# Altium footprint library Vowstar_Connector.PcbLib: 127 footprints (part 8 of 8)
Each footprint in its own frame and in the unit in brackets; x right, y up, seen from the top. Pads: shape width x height; smd on the part's side, far side on the other; paste and mask are expansions set on the pad; w line width, h text height; cw(c..) or ccw(c..) is an arc to the next point about the centre after c.
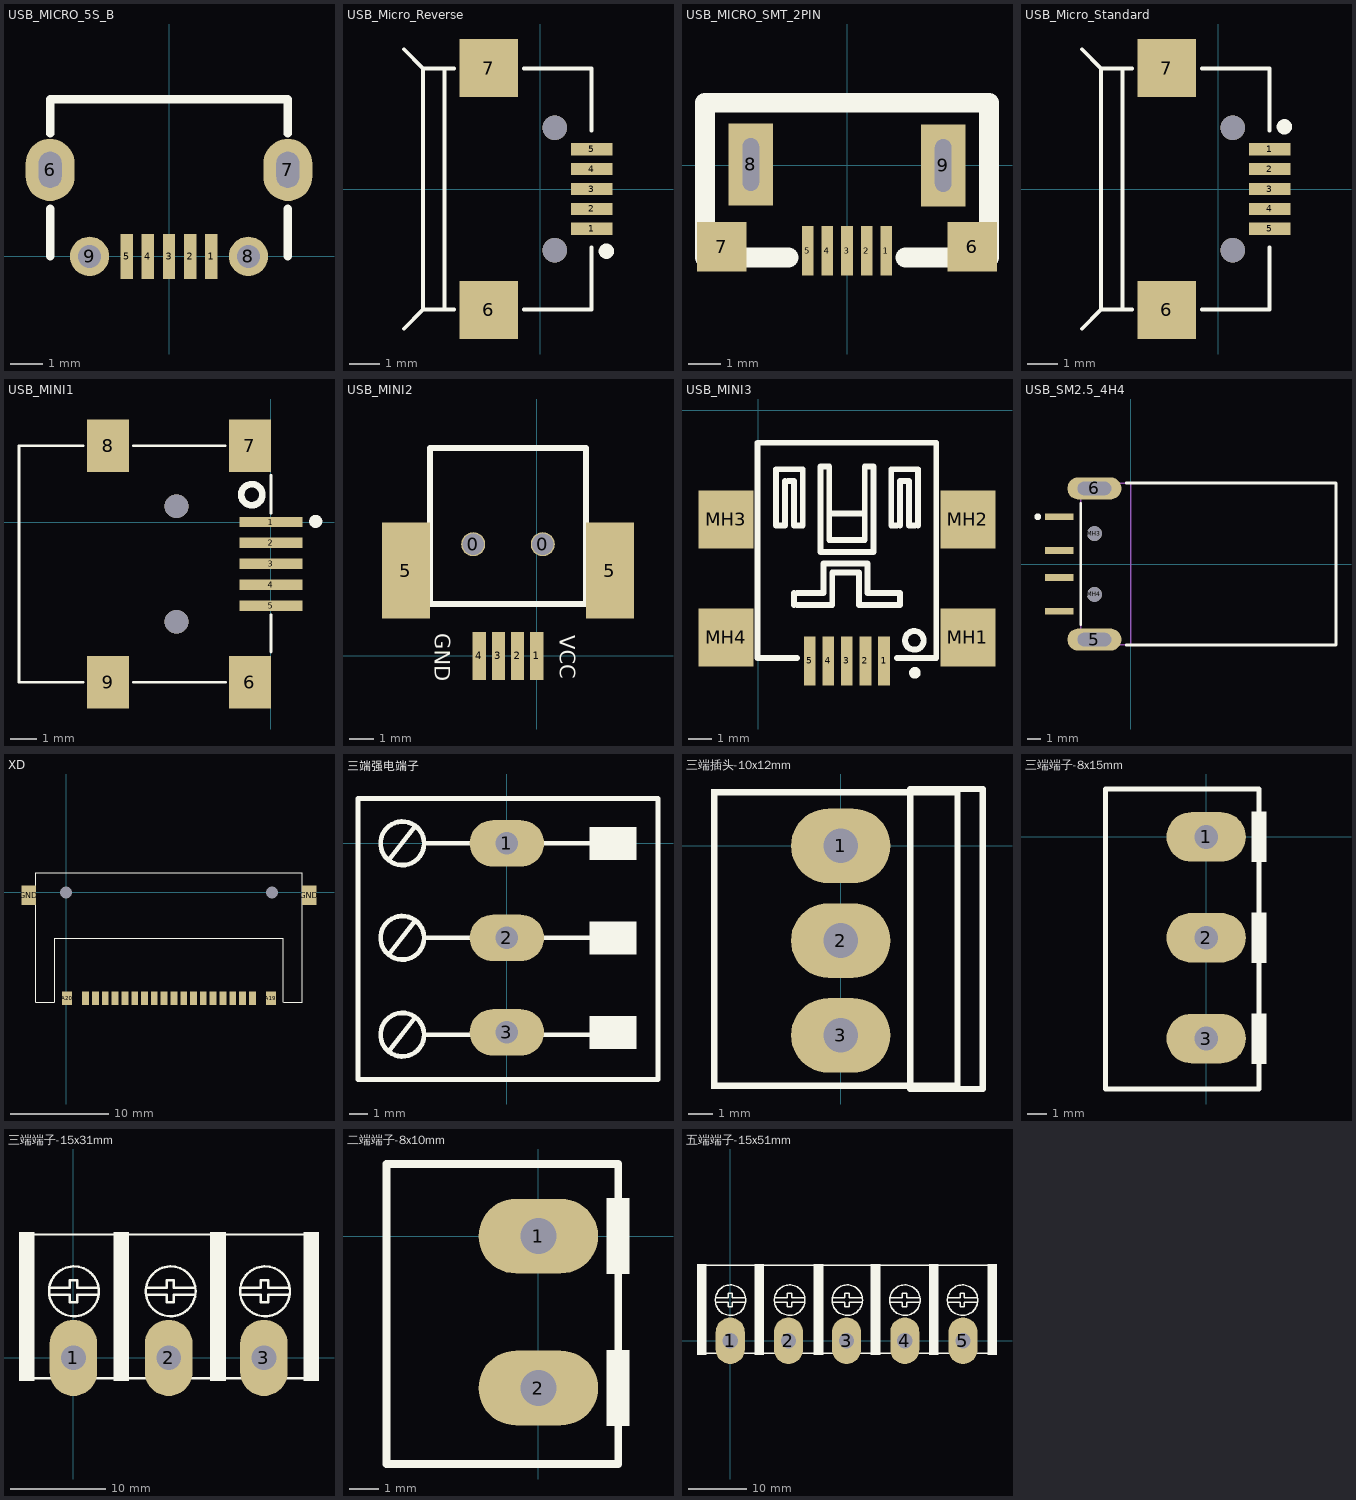
[diagram p7: the footprints below, top view; thin cyan lines are the x and y axes]

## USB_MICRO_5S_B [mil] "USB Micro SMT 5S B"
height 118.11
pads (9):
  rect 15x54 smd: 1(51,0) 2(25.5,0) 3(0,0) 4(-25.5,0) 5(-51,0)
  oval 59.06x74.8 hole 27.56 slot 43.31 at 90 deg: 6(-143,104) 7(143,104)
  round 47.24 hole 27.5: 8(95.5,0) 9(-95.5,0)
Top Overlay:
  lines w10: -142.72,0 -142.72,57.28 ; -142.72,147.72 -142.72,188.98 142.72,188.98 142.72,147.72 ; 142.72,0 142.72,57.28
3D body "User Library-Micro USB-B_Molex_105017-0001.step": height 105.31, standoff -24.61, extent -161.42,-9.33 161.41,204.44

## USB_Micro_Reverse [mm] "Micro USB Dock 5 Pin Reverse"
height 3
pads (7):
  rect 1.35x0.4 smd: 1(1.679,-1.3) 2(1.679,-0.65) 3(1.679,0) 4(1.679,0.65) 5(1.679,1.3)
  rect 1.9x1.9 smd: 6(-1.679,-3.95) 7(-1.679,3.95)
via 0.471,-2 diameter 0.8 hole 0.8
via 0.471,2 diameter 0.8 hole 0.8
Top Overlay:
  circle w0.25: c2.161,-2.032 r0.125
  lines w0.127: -4.459,-4.567 -3.829,-3.937 -2.813,-3.937 ; -4.459,4.567 -3.829,3.937 -2.813,3.937 ; -3.829,-3.9 -3.829,3.9 ; -3.13,-3.863 -3.13,3.937 ; -0.527,-3.937 1.679,-3.937 ; -0.527,3.937 1.679,3.937 ; 1.679,-3.9 1.679,-1.905 ; 1.679,1.905 1.679,3.9
3D body "User Library-Micro USB.step": height 2.67, standoff -0.27, extent -4.318,-3.99 1.112,3.99

## USB_MICRO_SMT_2PIN [mm] "USB MICRO SMT 2PIN"
height 3
pads (9):
  rect 0.35x1.5 smd: 1(1.2,-2.59) 2(0.6,-2.59) 3(0,-2.59) 4(-0.6,-2.59) 5(-1.2,-2.59)
  rrect0% 1.5x1.5 smd: 6(3.81,-2.47) 7(-3.81,-2.47)
  rect 1.35x2.5 hole 0.5 slot 1.6 at 90 deg: 8(-2.925,0.03) 9(2.925,0)
Top Overlay:
  lines w0.6: -1.778,-2.8 -4.318,-2.8 -4.318,1.91 4.318,1.91 4.318,-2.8 1.778,-2.8

## USB_Micro_Standard [mm] "Micro USB Dock 5 Pin Standard"
height 3
pads (7):
  rect 1.35x0.4 smd: 1(1.679,1.3) 2(1.679,0.65) 3(1.679,0) 4(1.679,-0.65) 5(1.679,-1.3)
  rect 1.9x1.9 smd: 6(-1.679,-3.95) 7(-1.679,3.95)
via 0.471,-2 diameter 0.8 hole 0.8
via 0.471,2 diameter 0.8 hole 0.8
Top Overlay:
  circle w0.25: c2.161,2.032 r0.125
  lines w0.127: -4.459,-4.567 -3.829,-3.937 -2.813,-3.937 ; -4.459,4.567 -3.829,3.937 -2.813,3.937 ; -3.829,-3.9 -3.829,3.9 ; -3.13,-3.863 -3.13,3.937 ; -0.527,-3.937 1.679,-3.937 ; -0.527,3.937 1.679,3.937 ; 1.679,-3.9 1.679,-1.905 ; 1.679,1.905 1.679,3.9
3D body "User Library-Micro USB.step": height 2.67, standoff -0.27, extent -4.318,-3.99 1.112,3.99

## USB_MINI1 [mm] "USB Mini SMT"
height 5.08
pads (9):
  rect 2.4x0.4 smd: 1(0,0) 2(0,-0.8) 3(0,-1.6) 4(0,-2.4) 5(0,-3.2)
  rect 1.6x2 smd: 6(-0.8,-6.1) 7(-0.8,2.9) 8(-6.2,2.9) 9(-6.2,-6.1)
via -3.6,0.6 diameter 0.9 hole 0.9
via -3.6,-3.8 diameter 0.9 hole 0.9
Top Overlay:
  circle w0.254: c-0.732,1.041 r0.402
  circle w0.25: c1.704,0.025 r0.125
  lines w0.1: -7.163,-6.1 -9.6,-6.1 -9.6,2.9 -7.163,2.9 ; -5.248,-6.1 -1.727,-6.1 ; -5.248,2.9 -1.752,2.9 ; 0,-4.953 0,-3.531 ; 0,0.33 0,1.778
3D body "User Library-USB_mini_B.step": height 3.95, standoff -1, extent -9.525,-6.95 -0.325,3.75

## USB_MINI2 [mm] "USB Mini SMT"
height 5.08
pads (8):
  round 1 hole 0.9: 0(-2.65,4.65) 0(0.25,4.65)
  rect 0.55x2 smd: 1(0,0) 2(-0.8,0) 3(-1.6,0) 4(-2.4,0)
  rect 2x4 smd: 5(-5.45,3.55) 5(3.05,3.55)
Top Overlay:
  lines w0.254: -4.45,2.15 -4.45,8.65 2.05,8.65 2.05,2.15 -4.45,2.15
  text "VCC" at 0.95,0.85 h0.64
  text "GND" at -4.25,0.95 h0.64

## USB_MINI3 [mm] "USB Mini SMT"
height 5.08
pads (9):
  rect 0.5x2.096 smd: 1(5.404,-10.792) 2(4.604,-10.792) 3(3.804,-10.792) 4(3.004,-10.792) 5(2.204,-10.792)
  rect 2.35x2.5 smd: MH1(9.017,-9.779) MH2(9.017,-4.699) MH3(-1.397,-4.699) MH4(-1.397,-9.779)
Top Overlay:
  circle w0.254: c6.71,-9.906 r0.402
  circle w0.25: c6.733,-11.303 r0.125
  lines w0.254: 1.143,-3.048 1.143,-4.953 0.762,-4.953 0.762,-2.54 1.905,-2.54 1.905,-4.953 1.524,-4.953 1.524,-3.048 1.27,-3.048 ; 1.524,-8.382 1.524,-7.874 ; 1.651,-10.668 -0.046,-10.668 -0.046,-1.397 7.654,-1.397 7.654,-10.668 5.969,-10.668 ; 1.651,-8.382 3.175,-8.382 3.175,-6.985 4.318,-6.985 4.318,-8.382 6.096,-8.382 6.096,-7.874 4.699,-7.874 4.699,-6.604 2.794,-6.604 2.794,-7.874 1.651,-7.874 ; 3.048,-4.445 4.572,-4.445 ; 5.969,-4.953 5.715,-4.953 5.715,-2.54 6.858,-2.54 6.858,-4.953 ; 6.096,-4.953 6.096,-3.048 6.477,-3.048 6.477,-4.953 6.731,-4.953 ; 2.667,-6.096 2.667,-2.413 3.048,-2.413 3.048,-5.588 4.572,-5.588 4.572,-2.413 4.953,-2.413 4.953,-6.096 2.667,-6.096

## USB_SM2.5_4H4 [mm] "Connector; USB1.1, Type A, SM; 4 Position; Right Angle"
height 4.5
pads (8):
  rect 2.1x0.5 smd: 1(-5.3,3.5) 2(-5.3,1) 3(-5.3,-1) 4(-5.3,-3.5)
  oval 4x1.65 hole 1 slot 2.5 at 0 deg: 5(-2.7,-5.6) 6(-2.7,5.6)
  round 1.1 hole 1.1 unplated paste-2.54 mask-2.54: MH3(-2.7,2.25) MH4(-2.7,-2.25)
Top Overlay:
  circle w0.25: c-6.9,3.5 r0.125
  lines w0.2: -3.7,-4.475 -3.7,4.475 ; -0.33,-6 15.2,-6 15.2,6 -0.33,6
Mechanical 13:
  lines w0.1: 0,-6 0,6 ; -3.7,-6 15.2,-6 15.2,6 -3.7,6 -3.7,-6
  text "PCB Edge" at 0.473,-5.173 h0.25
3D body "User Library-USBSM2.5-4H4.step": height 3.12, standoff -2.58, extent -5.702,-6.248 14.998,6.252

## XD [mm]
pads (24):
  round 0 hole 1.2 unplated: 0(21,0) 1(0,0)
  rect 0.7x1.4 smd: A1(19,-10.8) A2(18,-10.8) A3(17,-10.8) A4(16,-10.8) A5(15,-10.8) A6(14,-10.8) A7(13,-10.8) A8(12,-10.8) A9(11,-10.8) A10(10,-10.8) A11(9,-10.8) A12(8,-10.8) A13(7,-10.8) A14(6,-10.8) A15(5,-10.8) A16(4,-10.8) A17(3,-10.8) A18(2,-10.8)
  rect 1x1.4 smd: A19(20.9,-10.8) A20(0.1,-10.8)
  rect 1.5x2 smd: GND(-3.8,-0.3) GND(24.8,-0.3)
Top Overlay:
  lines w0.127: -1.2,-11.19 -3.1,-11.19 -3.1,2.01 24.1,2.01 24.1,-11.19 22.2,-11.19 ; -1.16,-11.19 -1.16,-4.69 22.14,-4.69 22.14,-11.19

## 三端强电端子 [mm] "三端强电端子"
height 15
pads (3):
  oval 4x2.5 hole 1.2: 1(0,0) 2(0,-5.08) 3(0,-10.16)
Top Overlay:
  circle w0.254: c-5.616,-10.287 r1.171
  circle w0.254: c-5.616,-5.08 r1.171
  circle w0.254: c-5.616,0 r1.171
  rectangle: 4.445,-11.049 6.985,-9.271
  rectangle: 4.445,-5.969 6.985,-4.191
  rectangle: 4.445,-0.889 6.985,0.889
  lines w0.254: -6.35,-11.176 -4.953,-9.398 ; -6.35,-5.969 -4.953,-4.191 ; -6.35,-0.889 -4.953,0.889 ; -4.445,-10.287 4.572,-10.287 ; -4.445,-5.08 4.445,-5.08 ; -4.445,0 4.953,0 ; -8.001,-12.7 -8.001,2.413 8.128,2.413 8.128,-12.7 -8.001,-12.7
3D body: height 16, standoff 0, extent -8.001,-12.573 8.001,2.286

## 三端插头-10x12mm [mm] "三端插头10x12mm"
height 13
pads (3):
  oval 4x3 hole 1.4: 1(0,0) 2(0,-3.81) 3(0,-7.62)
Top Overlay:
  rectangle: -5.207,2.032 4.826,2.286
  rectangle: 4.572,-9.779 4.826,2.286
  rectangle: -5.207,-9.779 4.826,-9.525
  rectangle: -5.207,-9.779 -4.953,2.286
  lines w0.254: 2.794,-9.779 2.794,2.286 5.715,2.286 5.715,-9.779 2.794,-9.779
3D body: height 13, standoff -1, extent -0.508,-8.001 0.508,-7.239
3D body: height 13, standoff -1, extent -0.508,-4.191 0.508,-3.429
3D body: height 13, standoff -1, extent -0.508,-0.381 0.508,0.381
3D body: height 13, standoff 0, extent 2.667,-9.652 5.588,2.159
3D body: height 3, standoff 0, extent -5.08,-9.652 5.588,2.159

## 三端端子-8x15mm [mm] "三端端子-8x15mm"
height 10
pads (3):
  oval 4x2.5 hole 1.2: 1(0,0) 2(0,-5.08) 3(0,-10.16)
Top Overlay:
  rectangle: 2.286,-11.43 3.048,-8.89
  rectangle: 2.286,-6.35 3.048,-3.81
  rectangle: 2.286,-1.27 3.048,1.27
  lines w0.254: -5.08,-12.7 2.667,-12.7 2.667,2.413 -5.08,2.413 -5.08,-12.7

## 三端端子-15x31mm [mm] "三端端子-15x31mm"
height 15
pads (3):
  oval 5x8 hole 2.6: 1(0,0) 2(10,0) 3(20,0)
Top Overlay:
  circle w0.254: c0.052,6.985 r2.615
  circle w0.254: c10.212,6.985 r2.615
  circle w0.254: c20.118,6.985 r2.615
  rectangle: 24.13,-2.413 25.781,13.208
  rectangle: 14.351,-2.413 16.002,13.208
  rectangle: 4.191,-2.413 5.842,13.208
  rectangle: -5.715,-2.413 -4.064,13.208
  lines w0.254: -5.588,-2.159 -5.588,12.954 25.654,12.954 25.654,-2.159 ; -5.588,-2.134 25.654,-2.134 ; -2.54,6.604 -0.381,6.604 -0.381,5.842 0.381,5.842 0.381,6.604 2.54,6.604 ; -2.54,7.366 -0.381,7.366 -0.381,8.128 0.381,8.128 0.381,7.366 2.54,7.366 ; 7.62,6.604 9.779,6.604 9.779,5.842 10.541,5.842 10.541,6.604 12.7,6.604 ; 7.62,7.366 9.779,7.366 9.779,8.128 10.541,8.128 10.541,7.366 12.7,7.366 ; 17.526,6.604 19.685,6.604 19.685,5.842 20.447,5.842 20.447,6.604 22.606,6.604 ; 17.526,7.366 19.685,7.366 19.685,8.128 20.447,8.128 20.447,7.366 22.606,7.366

## 二端端子-8x10mm [mm] "二端端子-8x15mm"
height 10
pads (2):
  oval 4x2.5 hole 1.2: 1(0,0) 2(0,-5.08)
Top Overlay:
  rectangle: 2.286,-6.35 3.048,-3.81
  rectangle: 2.286,-1.27 3.048,1.27
  lines w0.254: -5.08,-7.62 2.667,-7.62 2.667,2.413 -5.08,2.413 -5.08,-7.62
3D body "User Library-2 Way PCB Screw Terminal Block 5.08mm.STEP": height 15.2, standoff -3.5, extent -4.428,-7.54 4.572,2.46

## 五端端子-15x51mm [mm] "五端端子-15x51mm"
height 15
pads (5):
  oval 5x8 hole 2.6: 1(0,0) 2(10,0) 3(20,0) 4(30,0) 5(40,0)
Top Overlay:
  circle w0.254: c20.118,6.985 r2.615
  circle w0.254: c10.212,6.985 r2.615
  circle w0.254: c0.052,6.985 r2.615
  circle w0.254: c30.024,6.985 r2.615
  circle w0.254: c39.93,6.985 r2.615
  rectangle: 44.196,-2.413 45.847,13.208
  rectangle: 34.163,-2.413 35.814,13.208
  rectangle: -5.715,-2.413 -4.064,13.208
  rectangle: 4.191,-2.413 5.842,13.208
  rectangle: 14.351,-2.413 16.002,13.208
  rectangle: 24.13,-2.413 25.781,13.208
  lines w0.254: -5.588,-2.159 -5.588,12.954 45.654,12.954 ; -5.588,-2.134 45.654,-2.134 ; -2.54,6.604 -0.381,6.604 -0.381,5.842 0.381,5.842 0.381,6.604 2.54,6.604 ; -2.54,7.366 -0.381,7.366 -0.381,8.128 0.381,8.128 0.381,7.366 2.54,7.366 ; 7.62,6.604 9.779,6.604 9.779,5.842 10.541,5.842 10.541,6.604 12.7,6.604 ; 7.62,7.366 9.779,7.366 9.779,8.128 10.541,8.128 10.541,7.366 12.7,7.366 ; 17.526,6.604 19.685,6.604 19.685,5.842 20.447,5.842 20.447,6.604 22.606,6.604 ; 17.526,7.366 19.685,7.366 19.685,8.128 20.447,8.128 20.447,7.366 22.606,7.366 ; 25.654,-2.134 25.654,12.954 ; 27.432,6.604 29.591,6.604 29.591,5.842 30.353,5.842 30.353,6.604 32.512,6.604 ; 27.432,7.366 29.591,7.366 29.591,8.128 30.353,8.128 30.353,7.366 32.512,7.366 ; 37.338,6.604 39.497,6.604 39.497,5.842 40.259,5.842 40.259,6.604 42.418,6.604 ; 37.338,7.366 39.497,7.366 39.497,8.128 40.259,8.128 40.259,7.366 42.418,7.366